# Altium footprint library PcbLib Semiconductores.PcbLib: 20 footprints (part 2 of 2)
Each footprint in its own frame and in the unit in brackets; x right, y up, seen from the top. Pads: shape width x height; smd on the part's side, far side on the other; paste and mask are expansions set on the pad; w line width, h text height; cw(c..) or ccw(c..) is an arc to the next point about the centre after c.
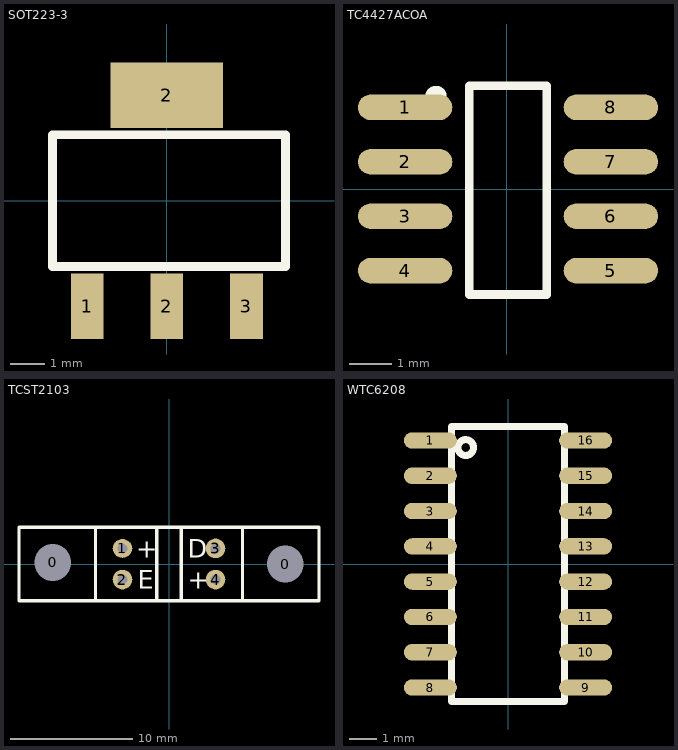
[diagram p1: the footprints below, top view; thin cyan lines are the x and y axes]

## SOT223-3 [mm] "SOT223-3"
pads (4):
  rect 0.95x1.9 smd: 1(-2.3,-3.05) 2(0,-3.05) 3(2.3,-3.05)
  rect 3.25x1.9 smd: 2(0,3.05)
Top Overlay:
  lines w0.254: -3.302,-1.905 -3.302,1.905 3.429,1.905 3.429,-1.905 -3.302,-1.905
3D body "SOT223-3.step": height 1.6, standoff 0, extent -3.188,-3.518 3.312,3.556

## TC4427ACOA [mm] "TC4427ACOA SOIC Dual High-Speed Power MOSFET Drivers"
pads (8):
  oval 2.2x0.6 smd: 1(-2.371,1.905) 2(-2.371,0.635) 3(-2.371,-0.635) 4(-2.371,-1.905) 5(2.429,-1.905) 6(2.429,-0.635) 7(2.429,0.635) 8(2.429,1.905)
Top Overlay:
  circle w0.25: c-1.651,2.159 r0.125
  lines w0.2: -0.871,-2.461 0.929,-2.461 0.929,2.413 -0.871,2.413 -0.871,-2.461
3D body "SOIC8-TC4427A.stp": height 0.75, standoff -1, extent -2.89,-2.45 2.89,2.45

## TCST2103 [mm] "OPTOACOPLADOR - TCST2103 - SENSOR OPTICO RANURADO SALIDA A TRANSISTOR"
pads (6):
  round 1.524 hole 3: 0(-9.5,0.127) 0(9.5,0)
  oval 1.6x1.524 hole 0.8: 1(-3.8,1.27)
  round 1.6 hole 0.8: 2(-3.8,-1.27) 3(3.8,1.27) 4(3.8,-1.27)
Top Overlay:
  lines w0.254: -6,-3 -6,3 ; -1,-3 -1,3 ; 1,-3 1,3 ; 6,-3 6,3 ; -12.25,-3 -12.25,3 12.25,3 12.25,-3 -12.25,-3
  text "+" at 1.524,-2.032 h1.52
  text "D" at 1.524,0.508 h1.52
  text "E" at -2.54,-2.032 h1.52
  text "+" at -2.667,0.508 h1.52
3D body "TCST2103.stp": height 10.81, standoff -2, extent -12.25,-3.175 12.25,3.125

## WTC6208 [mil] "WTC6208 TOUCH SENSOR 8 BUTTONS"
height 104.33
pads (16):
  oval 75x23 smd: 1(-110,175) 2(-110,125) 3(-110,75) 4(-110,25) 5(-110,-25) 6(-110,-75) 7(-110,-125) 8(-110,-175) 9(110,-175) 10(110,-125) 11(110,-75) 12(110,-25) 13(110,25) 14(110,75) 15(110,125) 16(110,175)
Top Overlay:
  circle w10: c-60,165 r11.18
  lines w10: -80,-195.1 -80,195 80,195 80,-195.1 ; -80,-195 80,-195
3D body "WTC6208.stp": height 68.9, standoff 0, extent -113.79,-196.85 113.77,196.85